# Altium footprint library 3D封装库.PcbLib: 716 footprints (part 42 of 45)
Each footprint in its own frame and in the unit in brackets; x right, y up, seen from the top. Pads: shape width x height; smd on the part's side, far side on the other; paste and mask are expansions set on the pad; w line width, h text height; cw(c..) or ccw(c..) is an arc to the next point about the centre after c.
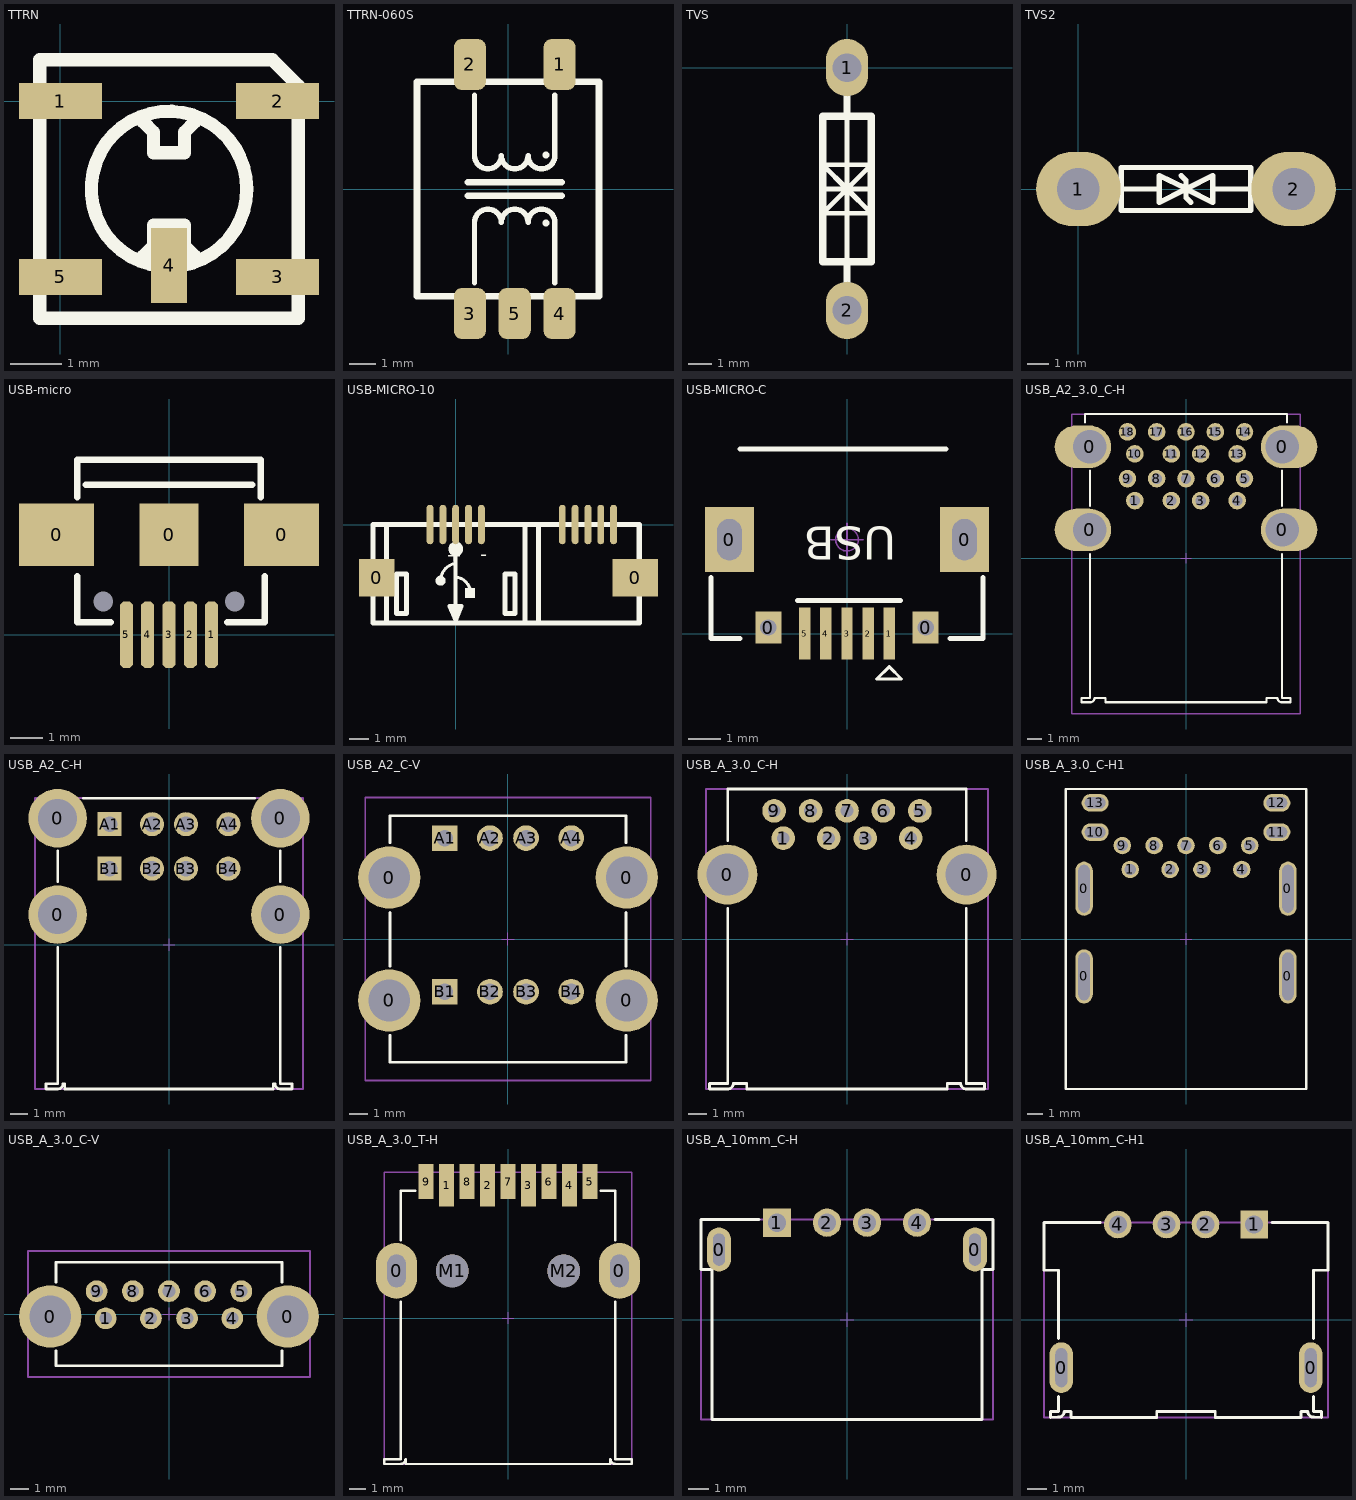
[diagram p41: the footprints below, top view; thin cyan lines are the x and y axes]

## TTRN [mm]
pads (5):
  rect 1.6x0.7 smd: 1(0,0) 2(4.2,0) 3(4.2,-3.4) 5(0,-3.4)
  rect 0.7x1.45 smd: 4(2.1,-3.175)
Top Overlay:
  circle w0.254: c2.1,-1.7 r1.503
  lines w0.254: 1.6,-3 1.8,-2.8 1.8,-2.4 2.4,-2.4 2.4,-2.8 2.6,-3 ; 1.6,-0.4 1.8,-0.6 1.8,-1 2.4,-1 2.4,-0.6 2.6,-0.4 ; -0.4,-4.2 -0.4,0.8 4.1,0.8 4.6,0.3 4.6,-4.2 -0.4,-4.2

## TTRN-060S [mm]
pads (5):
  rrect50% 1.2x1.9 smd: 1(1.925,4.65) 2(-1.425,4.65) 3(-1.425,-4.65) 4(1.925,-4.65) 5(0.25,-4.65)
Top Overlay:
  circle w0.203: c1.414,-1.27 r0.025
  circle w0.203: c1.414,1.27 r0.025
  lines w0.203: -1.25,-3.5 -1.25,-1.25 cw(c-0.75,-1.25) -0.25,-1.25 cw(c0.25,-1.25) 0.75,-1.25 cw(c1.25,-1.25) 1.75,-1.25 1.75,-3.5 ; -1.25,3.5 -1.25,1.25 ccw(c-0.75,1.25) -0.25,1.25 ccw(c0.25,1.25) 0.75,1.25 ccw(c1.25,1.25) 1.75,1.25 1.75,3.5
  lines w0.25: -1.5,-0.25 2,-0.25 ; -1.5,0.25 2,0.25 ; -3.4,-4 3.4,-4 3.4,4 -3.4,4 -3.4,-4

## TVS [mm]
pads (2):
  oval 1.778x2.4 hole 1.2: 1(0,0) 2(0,-10.16)
Top Overlay:
  lines w0.2: -1.016,-5.08 1.016,-5.08 ; 0,-8.128 0,-2.032 ; -1.016,-6.096 1.016,-4.064 -1.016,-4.064 0,-5.08 1.016,-6.096 -1.016,-6.096
  lines w0.305: 0,-9.144 0,-8.128 ; 0,-2.032 0,-1.016 ; -1.016,-8.128 1.016,-8.128 1.016,-2.032 -1.016,-2.032 -1.016,-8.128
3D body: height 3.25, standoff 0.25, extent -1.524,-8.58 1.476,-1.58
3D body "AXIAL-0.4-0.25W.STEP": height 2, standoff -3.26, extent -1.264,-10.408 1.256,0.352

## TVS2 [mm]
pads (2):
  oval 4x3.5 hole 2: 1(0,0) 2(10.16,0)
Top Overlay:
  lines w0.254: 1.016,0 2.032,0 3.81,0 ; 4.851,0.635 5.08,0.406 ; 5.08,-0.406 5.309,-0.635 ; 5.08,-0.4 5.08,0.4 ; 5.08,0.025 3.81,0.635 3.81,-0.635 5.08,0 ; 6.35,0 8.128,0 9.144,0 ; 5.08,0 6.35,0.635 6.35,-0.635 5.08,0 ; 2.032,-1.016 8.128,-1.016 8.128,1.016 2.032,1.016 2.032,-1.016

## USB-micro [mil]
pads (10):
  rect 90x74.8 smd: 0(-135,120) 0(135,120)
  round 0 hole 23.62: 0(-79,39.98) 0(79,39.98)
  rect 70.87x74.8 smd: 0(0,120)
  oct 15.75x80 smd: 1(51.18,0) 2(25.59,0) 3(0,0) 4(-25.59,0) 5(-51.18,0)
Top Overlay:
  lines w7.87: -110,70 -110,15 -70,15 ; -110,165 -110,210 110,210 110,165 ; -100,180 100,180 ; 70,15 115,15 115,70
3D body "User Library-MicroAB.STEP": height 111.19, standoff -6.93, extent -174.41,15 172.05,235.47

## USB-MICRO-10 [mm]
pads (12):
  rect 1.8x1.9 smd: 0(-4,-2.7)
  rect 2.3x1.9 smd: 0(9.1,-2.7)
  oval 0.35x2 smd: 1(-1.3,0) 2(-0.65,0) 3(0,0) 4(0.65,0) 5(1.3,0) 6(5.4,0) 7(6.05,0) 8(6.7,0) 9(7.35,0) 10(8,0)
Top Overlay:
  circle w0.381: c0.002,-1.238 r0.178
  circle w0.254: c-0.767,-2.847 r0.127
  region: 0.987,-3.219 0.477,-3.219 0.477,-3.729 0.987,-3.729
  lines w0.152: -0.768,-2.802 cw(c0.119,-2.854) 0,-1.973 ; 0,-2.65 cw(c-0.119,-3.531) 0.727,-3.261
  lines w0.203: 0,-4.132 0,-4.896 ; 0,-1.373 0,-4.896 ; 0,-4.896 0.3,-4.134 -0.31,-4.134 0,-4.896
  lines w0.254: -3.5,-5 -3.5,0 ; 3.5,-5 3.5,0 ; 4.2,-5 4.2,0 ; -4.2,-5 9.3,-5 9.3,0 -4.2,0 -4.2,-5 ; -3,-4.5 -2.5,-4.5 -2.5,-2.5 -3,-2.5 -3,-4.5 ; 2.5,-4.5 3,-4.5 3,-2.5 2.5,-2.5 2.5,-4.5
  lines w0.381: 0,-4.337 0,-4.235
  text "-   +" at 1.6,-1.3 h0.7

## USB-MICRO-C [mm]
pads (9):
  rect 1.5x2 hole 0.762 slot 1.27 at 90 deg: 0(-3.625,2.9) 0(3.625,2.9)
  rect 0.8x1 hole 0.5: 0(-2.425,0.19) 0(2.425,0.19)
  rect 0.35x1.6 smd: 1(1.3,0) 2(0.65,0) 3(0,0) 4(-0.65,0) 5(-1.3,0)
Top Overlay:
  lines w0.1: 0.919,-1.397 1.681,-1.397 1.3,-1.016 0.919,-1.397
  lines w0.152: -4.191,1.732 -4.191,-0.148 -3.302,-0.148 ; -3.302,5.694 3.048,5.694 ; -1.525,1.025 1.65,1.025 ; 3.175,-0.148 4.191,-0.148 4.191,1.732
  text "USB" at 1.524,3.302 h1.02
Mechanical 15:
  circle w0.05: c0,2.9 r0.35
  lines w0.05: -0.5,2.9 0.5,2.9 ; 0,2.4 0,3.4
3D body "USB micro_A.STEP": height 2.8, standoff -0.95, extent -4.001,0.01 4.001,5.61

## USB_A2_3.0_C-H [mm] "USB 3.0 Type A Stacked"
height 15.42
pads (22):
  oval 3.85x2.9 hole 2.3 copper offset -0.475,0: 0(-6.57,1.93) 0(-6.57,7.61)
  oval 3.85x2.9 hole 2.3 copper offset 0.475,0: 0(6.57,1.93) 0(6.57,7.61)
  round 1.2 hole 0.7: 1(-3.5,3.93) 2(-1,3.93) 3(1,3.93) 4(3.5,3.93) 5(4,5.43) 6(2,5.43) 7(0,5.43) 8(-2,5.43) 9(-4,5.43) 10(-3.5,7.13) 11(-1,7.13) 12(1,7.13) 13(3.5,7.13) 14(4,8.63) 15(2,8.63) 16(0,8.63) 17(-2,8.63) 18(-4,8.63)
Top Overlay:
  lines w0.15: -6.9,9.26 -6.9,9.85 6.9,9.85 6.9,9.26 ; -6.55,0.28 -6.55,-9.55 -7.15,-9.55 -7.15,-9.85 -6.56,-9.85 ccw(c-6.55,-9.55) -6.25,-9.55 -5.5,-9.55 -5.5,-9.85 5.5,-9.85 5.5,-9.55 6.25,-9.55 ccw(c6.55,-9.55) 6.56,-9.85 7.15,-9.85 7.15,-9.55 6.55,-9.55 6.55,0.28 ; -6.55,3.58 -6.55,5.97 ; 6.55,3.58 6.55,5.97
Mechanical 13:
  lines w0.1: -7.795,-10.65 7.795,-10.65 7.795,9.85 -7.795,9.85 -7.795,-10.65
Mechanical 15:
  lines w0.05: -0.35,0 0.35,0 ; 0,-0.35 0,0.35
3D body "692141030100.stp": height 16.11, standoff -3.5, extent -7.794,-10.65 7.794,9.85

## USB_A2_C-H [mm] "USB 2.0 Type A Horizontal Dual Stacked"
height 15.34
pads (12):
  round 3.45 hole 2.3: 0(-6.57,1.78) 0(-6.57,7.46) 0(6.57,1.78) 0(6.57,7.46)
  rect 1.42x1.42 hole 0.92: A1(-3.5,7.11) B1(-3.5,4.49)
  round 1.42 hole 0.92: A2(-1,7.11) A3(1,7.11) A4(3.5,7.11) B2(-1,4.49) B3(1,4.49) B4(3.5,4.49)
Top Overlay:
  lines w0.15: -6.55,-0.14 -6.55,-8.2 -7.25,-8.2 -7.25,-8.5 -6.56,-8.5 ccw(c-6.55,-8.2) -6.25,-8.2 -6.15,-8.2 -6.15,-8.5 6.15,-8.5 6.15,-8.2 6.25,-8.2 ccw(c6.55,-8.2) 6.56,-8.5 7.25,-8.5 7.25,-8.2 6.55,-8.2 6.55,-0.14 ; -6.55,3.71 -6.55,5.54 ; -5.06,8.65 5.06,8.65 ; 6.55,3.71 6.55,5.54
Mechanical 13:
  lines w0.1: -7.9,-8.5 -7.9,8.65 7.9,8.65 7.9,-8.5 -7.9,-8.5
Mechanical 15:
  lines w0.05: -0.35,0 0.35,0 ; 0,-0.35 0,0.35
3D body "61400826021.stp": height 15.93, standoff -3.91, extent -7.912,-8.5 7.912,8.65

## USB_A2_C-V [mm] "USB 2.0 Type A Vertical Dual"
height 16.7
pads (12):
  round 3.45 hole 2.3: 0(-6.57,-3.4) 0(-6.57,3.4) 0(6.57,-3.4) 0(6.57,3.4)
  rect 1.42x1.42 hole 0.92: A1(-3.5,5.58) B1(-3.5,-2.92)
  round 1.42 hole 0.92: A2(-1,5.58) A3(1,5.58) A4(3.5,5.58) B2(-1,-2.92) B3(1,-2.92) B4(3.5,-2.92)
Top Overlay:
  lines w0.15: -6.52,-5.33 -6.52,-6.82 6.52,-6.82 6.52,-5.33 ; -6.52,-1.5 -6.52,1.47 ; -6.52,5.33 -6.52,6.82 6.52,6.82 6.52,5.33 ; 6.52,-1.5 6.52,1.47
Mechanical 1:
  text "PCB Thickness 1.6mm" at -3.2,-8.5 h0.76
Mechanical 13:
  lines w0.1: -7.89,-7.82 -7.89,7.82 7.89,7.82 7.89,-7.82 -7.89,-7.82
Mechanical 15:
  lines w0.05: -0.35,0 0.35,0 ; 0,-0.35 0,0.35
3D body "614008235023.stp": height 17.7, standoff -3.35, extent -7.889,-7.82 7.889,7.82

## USB_A_3.0_C-H [mm] "USB 3.0 Type A Horizontal"
height 6.99
pads (11):
  round 3.3 hole 2.3: 0(-6.57,3.54) 0(6.57,3.54)
  round 1.3 hole 0.7: 1(-3.5,5.54) 2(-1,5.54) 3(1,5.54) 4(3.5,5.54) 5(4,7.04) 6(2,7.04) 7(0,7.04) 8(-2,7.04) 9(-4,7.04)
Top Overlay:
  lines w0.15: -6.55,1.69 -6.55,-7.94 -7.55,-7.94 -7.55,-8.24 -6.56,-8.24 ccw(c-6.55,-7.94) -6.25,-7.94 -5.5,-7.94 -5.5,-8.24 5.5,-8.24 5.5,-7.94 6.25,-7.94 ccw(c6.55,-7.94) 6.56,-8.24 7.55,-8.24 7.55,-7.94 6.55,-7.94 6.55,1.69 ; -6.55,5.39 -6.55,8.24 6.55,8.24 6.55,5.39
Mechanical 13:
  lines w0.1: -7.74,-8.24 7.74,-8.24 7.74,8.24 -7.74,8.24 -7.74,-8.24
Mechanical 15:
  lines w0.05: -0.35,0 0.35,0 ; 0,-0.35 0,0.35
3D body "692121030100.stp": height 8.02, standoff -3.2, extent -7.74,-8.24 7.74,8.31

## USB_A_3.0_C-H1 [mm] "USB 3.1 Type A Receptacle Horizontal THT Power Delivery"
height 8.01
pads (17):
  oval 1.1x3.4 hole 0.7 slot 3 at 90 deg: 0(-6.4,-2.345) 0(-6.4,3.155) 0(6.4,-2.345) 0(6.4,3.155)
  round 1.1 hole 0.7: 1(-3.5,4.365) 2(-1,4.365) 3(1,4.365) 4(3.5,4.365) 5(4,5.865) 6(2,5.865) 7(0,5.865) 8(-2,5.865) 9(-4,5.865)
  oval 1.7x1.1 hole 0.7 slot 1.3 at 0 deg: 10(-5.7,6.705) 11(5.7,6.705) 12(5.7,8.545) 13(-5.7,8.545)
Top Overlay:
  lines w0.15: -7.55,-9.415 -7.55,9.415 7.55,9.415 7.55,-9.415 -7.55,-9.415
Mechanical 1:
  text "PCB Thickness 1.6mm" at -3.15,-10.15 h0.76
Mechanical 13:
  lines w0.1: -7.55,-9.415 7.55,-9.415 7.55,9.415 -7.55,9.415 -7.55,-9.415
Mechanical 15:
  lines w0.05: -0.35,0 0.35,0 ; 0,-0.35 0,0.35
3D body "632121300001.stp": height 8.01, standoff -1.81, extent -7.55,-9.415 7.55,9.415

## USB_A_3.0_C-V [mm] "USB 3.0 Type A Vertical THT"
height 15
pads (11):
  round 3.45 hole 2.3: 0(-6.57,-0.135) 0(6.57,-0.135)
  round 1.2 hole 0.7: 1(-3.5,-0.235) 2(-1,-0.235) 3(1,-0.235) 4(3.5,-0.235) 5(4,1.265) 6(2,1.265) 7(0,1.265) 8(-2,1.265) 9(-4,1.265)
Top Overlay:
  lines w0.15: -6.25,-2.035 -6.25,-2.855 6.25,-2.855 6.25,-2.035 ; -6.25,1.765 -6.25,2.865 6.25,2.865 6.25,1.765
Mechanical 13:
  lines w0.1: -7.8,-3.475 -7.8,3.485 7.8,3.485 7.8,-3.475 -7.8,-3.475
Mechanical 15:
  lines w0.05: -0.35,0 0.35,0 ; 0,-0.35 0,0.35
3D body "692121430000.stp": height 15.1, standoff -3.67, extent -7.8,-3.475 7.8,3.475

## USB_A_3.0_T-H [mm] "USB 3.0 Type A Horizontal SMD"
height 6.99
pads (13):
  oval 2.52x3.4 hole 1.12 slot 2 at 90 deg: 0(-6.8,2.885) 0(6.8,2.885)
  rect 0.9x2.6 smd: 1(-3.75,8.105) 2(-1.25,8.105) 3(1.25,8.105) 4(3.75,8.105)
  rect 0.9x2.15 smd: 5(5,8.33) 6(2.5,8.33) 7(0,8.33) 8(-2.5,8.33) 9(-5,8.33)
  round 2 hole 2 unplated: M1(-3.4,2.885) M2(3.4,2.885)
Top Overlay:
  lines w0.15: -6.55,1.005 -6.55,-8.595 -7.55,-8.595 -7.55,-8.895 -6.56,-8.895 ccw(c-6.55,-8.595) -6.25,-8.595 -6.25,-8.895 6.25,-8.895 6.25,-8.595 ccw(c6.55,-8.595) 6.56,-8.895 7.55,-8.895 7.55,-8.595 6.55,-8.595 6.55,1.005 ; -6.55,4.765 -6.55,7.765 -5.65,7.765 ; 5.65,7.765 6.55,7.765 6.55,4.765
Mechanical 13:
  lines w0.1: -7.55,-8.895 -7.55,8.905 7.55,8.905 7.55,-8.895 -7.55,-8.895
Mechanical 15:
  lines w0.05: -0.35,0 0.35,0 ; 0,-0.35 0,0.35
3D body "692122030100.stp": height 7.96, standoff -2.28, extent -7.55,-8.895 7.55,8.905

## USB_A_10mm_C-H [mm] "USB 2.0 Type A Horizontal THT Short Type"
height 5.72
pads (6):
  oval 1.2x2.2 hole 0.6 slot 1.6 at 90 deg: 0(-6.4,3.5) 0(6.4,3.5)
  rect 1.42x1.42 hole 0.92: 1(-3.5,4.85)
  round 1.42 hole 0.92: 2(-1,4.85) 3(1,4.85) 4(3.5,4.85)
Top Overlay:
  lines w0.15: -4.41,5 -7.3,5 -7.3,2.5 -6.75,2.5 -6.75,-5 6.75,-5 6.75,2.5 7.3,2.5 7.3,5 4.4,5
Mechanical 13:
  lines w0.1: -7.3,-5 7.3,-5 7.3,5 -7.3,5 -7.3,-5
Mechanical 15:
  lines w0.05: -0.35,0 0.35,0 ; 0,-0.35 0,0.35
3D body "614104190121.stp": height 5.94, standoff -1.77, extent -7.3,-5 7.3,5

## USB_A_10mm_C-H1 [mm] "USB 2.0 THT Type A Horizontal Slim Type"
height 6.82
pads (6):
  oval 1.2x2.6 hole 0.6 slot 2 at 90 deg: 0(-6.4,-2.45) 0(6.4,-2.45)
  rect 1.42x1.42 hole 0.92: 1(3.5,4.9)
  round 1.42 hole 0.92: 2(1,4.9) 3(-1,4.9) 4(-3.5,4.9)
Top Overlay:
  lines w0.15: -6.55,-3.93 -6.55,-4.69 -6.95,-4.69 -6.95,-5 -6.56,-4.99 ccw(c-6.55,-4.69) -6.25,-4.69 -5.9,-4.69 -5.9,-5 -1.5,-5 -1.5,-4.7 1.5,-4.7 1.5,-5 5.9,-5 5.9,-4.69 6.25,-4.69 ccw(c6.55,-4.69) 6.56,-4.99 6.95,-5 6.95,-4.69 6.55,-4.69 6.55,-3.93 ; -6.55,-0.96 -6.55,2.55 -7.3,2.55 -7.3,5 -4.4,5 ; 4.41,5 7.3,5 7.3,2.55 6.55,2.55 6.55,-0.96
Mechanical 13:
  lines w0.1: -7.3,-5 7.3,-5 7.3,5 -7.3,5 -7.3,-5
Mechanical 15:
  lines w0.05: -0.35,0 0.35,0 ; 0,-0.35 0,0.35
3D body "614104150121.stp": height 7.26, standoff -1.56, extent -7.3,-5 7.3,5